# Altium schematic symbol library NSC Switcher.SchLib: 2027 symbols (part 24 of 26) (continued)
## LMZ10503TZE-ADJ/NOPB
designator U?
3A, SIMPLE SWITCHER® Power Module with 5.5V Maximum Input, 7 pin TO-PMOD; PartNumber: LMZ10503TZE-ADJ/NOPB; Manufacturer: National Semiconductor; PackageTopMarking: NSUZXYTTE#*LMZ10503*TZ-ADJ; PowerWise: N; Published: 16-Nov-2010; DatasheetVersion: Jun-2010; PackageVersion: revC, 2009; PackageReference: TZA07A; Publisher: Altium Limited; PackageDescription: TO-PMOD-7, 10.16 x 13.77 x 4.57 mm Body, 7 Lead, 1.27mm Pitch, Surface Mount; Supplier 1: Digi-Key; Supplier Part Number 1: LMZ10503TZE-ADJ/NOPB-ND; Supplier 2: Farnell; Supplier Part Number 2: 1821759; RoHS: Y; PinCount: 7; CompType: Switcher; ComponentLink1Description: LMZ10503 Datasheet; ComponentLink1URL: http://www.national.com/ds/LM/LMZ10503.pdf; ComponentLink2Description: LMZ10503 Web Page; ComponentLink2URL: http://www.national.com/pf/LM/LMZ10503.html; ComponentLink3Description: TZA07A Package Page; ComponentLink3URL: http://www.national.com/packaging/folders/tza07a.html
footprint TZA07A_V (D2-PAK, 8-Leads, Body 9.9x10.2mm, Pitch 1.27mm, Lead Span 13.8mm, NSC Recommended)
pins: 1 VIN (in), 2 EN (in), 3 SS, 4 GND (power), 5 FB (in), 6 VOUT (out), 7 VOUT (out), 8 EP

## LMZ10503TZX-ADJ/NOPB
designator U?
3A, SIMPLE SWITCHER® Power Module with 5.5V Maximum Input, 7 pin TO-PMOD; PartNumber: LMZ10503TZX-ADJ/NOPB; Manufacturer: National Semiconductor; PackageTopMarking: NSUZXYTTE#*LMZ10503*TZ-ADJ; PowerWise: Y; Published: 16-Nov-2010; DatasheetVersion: Jun-2010; PackageVersion: revC, 2009; PackageReference: TZA07A; Publisher: Altium Limited; PackageDescription: TO-PMOD-7, 10.16 x 13.77 x 4.57 mm Body, 7 Lead, 1.27mm Pitch, Surface Mount; Supplier 1: Digi-Key; Supplier Part Number 1: LMZ10503TZX-ADJ-ND; RoHS: Y; PinCount: 7; CompType: Switcher; ComponentLink1Description: LMZ10503 Datasheet; ComponentLink1URL: http://www.national.com/ds/LM/LMZ10503.pdf; ComponentLink2Description: LMZ10503 Web Page; ComponentLink2URL: http://www.national.com/pf/LM/LMZ10503.html; ComponentLink3Description: TZA07A Package Page; ComponentLink3URL: http://www.national.com/packaging/folders/tza07a.html
footprint TZA07A_V (D2-PAK, 8-Leads, Body 9.9x10.2mm, Pitch 1.27mm, Lead Span 13.8mm, NSC Recommended)
pins: 1 VIN (in), 2 EN (in), 3 SS, 4 GND (power), 5 FB (in), 6 VOUT (out), 7 VOUT (out), 8 EP

## LMZ10504EXTTZ/NOPB
designator U?
4A, SIMPLE SWITCHER® Power Module with 5.5V Maximum Input Voltage for Military and Rugged Applications, 7 pin TO-PMOD; PartNumber: LMZ10504EXTTZ/NOPB; Manufacturer: National Semiconductor; PackageTopMarking: NSUZXYTTE#*LMZ10504*EXT; PowerWise: Y; Published: 16-Nov-2010; DatasheetVersion: Jul-2010; PackageVersion: revC, 2009; PackageReference: TZA07A; Publisher: Altium Limited; PackageDescription: TO-PMOD-7, 10.16 x 13.77 x 4.57 mm Body, 7 Lead, 1.27mm Pitch, Surface Mount; Supplier 1: Digi-Key; Supplier Part Number 1: LMZ10504EXTTZ/NOPBTR-ND; Supplier 2: Digi-Key; Supplier Part Number 2: LMZ10504EXTTZ/NOPBCT-ND; Supplier 3: Digi-Key; Supplier Part Number 3: LMZ10504EXTTZ/NOPBDKR-ND; RoHS: Y; PinCount: 7; CompType: Switcher; ComponentLink1Description: LMZ10504EXT Datasheet; ComponentLink1URL: http://www.national.com/ds/LM/LMZ10504EXT.pdf; ComponentLink2Description: LMZ10504EXT Web Page; ComponentLink2URL: http://www.national.com/pf/LM/LMZ10504EXT.html; ComponentLink3Description: TZA07A Package Page; ComponentLink3URL: http://www.national.com/packaging/folders/tza07a.html
footprint TZA07A_V (D2-PAK, 8-Leads, Body 9.9x10.2mm, Pitch 1.27mm, Lead Span 13.8mm, NSC Recommended)
pins: 1 VIN (in), 2 EN (in), 3 SS, 4 GND (power), 5 FB (in), 6 VOUT (out), 7 VOUT (out), 8 EP

## LMZ10504EXTTZE/NOPB
designator U?
4A, SIMPLE SWITCHER® Power Module with 5.5V Maximum Input Voltage for Military and Rugged Applications, 7 pin TO-PMOD; PartNumber: LMZ10504EXTTZE/NOPB; Manufacturer: National Semiconductor; PackageTopMarking: NSUZXYTTE#*LMZ10504*EXT; PowerWise: Y; Published: 16-Nov-2010; DatasheetVersion: Jul-2010; PackageVersion: revC, 2009; PackageReference: TZA07A; Publisher: Altium Limited; PackageDescription: TO-PMOD-7, 10.16 x 13.77 x 4.57 mm Body, 7 Lead, 1.27mm Pitch, Surface Mount; Supplier 1: Digi-Key; Supplier Part Number 1: LMZ10504EXTTZE/NOPB-ND; RoHS: Y; PinCount: 7; CompType: Switcher; ComponentLink1Description: LMZ10504EXT Datasheet; ComponentLink1URL: http://www.national.com/ds/LM/LMZ10504EXT.pdf; ComponentLink2Description: LMZ10504EXT Web Page; ComponentLink2URL: http://www.national.com/pf/LM/LMZ10504EXT.html; ComponentLink3Description: TZA07A Package Page; ComponentLink3URL: http://www.national.com/packaging/folders/tza07a.html
footprint TZA07A_V (D2-PAK, 8-Leads, Body 9.9x10.2mm, Pitch 1.27mm, Lead Span 13.8mm, NSC Recommended)
pins: 1 VIN (in), 2 EN (in), 3 SS, 4 GND (power), 5 FB (in), 6 VOUT (out), 7 VOUT (out), 8 EP

## LMZ10504EXTTZX/NOPB
designator U?
4A, SIMPLE SWITCHER® Power Module with 5.5V Maximum Input Voltage for Military and Rugged Applications, 7 pin TO-PMOD; PartNumber: LMZ10504EXTTZX/NOPB; Manufacturer: National Semiconductor; PackageTopMarking: NSUZXYTTE#*LMZ10504*EXT; PowerWise: Y; Published: 16-Nov-2010; DatasheetVersion: Jul-2010; PackageVersion: revC, 2009; PackageReference: TZA07A; Publisher: Altium Limited; PackageDescription: TO-PMOD-7, 10.16 x 13.77 x 4.57 mm Body, 7 Lead, 1.27mm Pitch, Surface Mount; Supplier 1: Digi-Key; Supplier Part Number 1: LMZ10504EXTTZX/NOPB-ND; RoHS: Y; PinCount: 7; CompType: Switcher; ComponentLink1Description: LMZ10504EXT Datasheet; ComponentLink1URL: http://www.national.com/ds/LM/LMZ10504EXT.pdf; ComponentLink2Description: LMZ10504EXT Web Page; ComponentLink2URL: http://www.national.com/pf/LM/LMZ10504EXT.html; ComponentLink3Description: TZA07A Package Page; ComponentLink3URL: http://www.national.com/packaging/folders/tza07a.html
footprint TZA07A_V (D2-PAK, 8-Leads, Body 9.9x10.2mm, Pitch 1.27mm, Lead Span 13.8mm, NSC Recommended)
pins: 1 VIN (in), 2 EN (in), 3 SS, 4 GND (power), 5 FB (in), 6 VOUT (out), 7 VOUT (out), 8 EP

## LMZ10504TZ-ADJ/NOPB
designator U?
4A SIMPLE SWITCHER® Power Module with 5.5V Maximum Input Voltage, 7-pin TO-PMOD, Pb-Free; PartNumber: LMZ10504TZ-ADJ/NOPB; Manufacturer: National Semiconductor; PackageTopMarking: NSUZXYTTE#*LMZ10504*TZ-ADJ; PowerWise: Y; Published: 25-Jan-2010; DatasheetVersion: Jan-2010; PackageVersion: revC, 2009; PackageReference: TZA07A; Publisher: Altium Limited; PackageDescription: TO-PMOD-7, 10.16 x 13.77 x 4.57 mm Body, 7 Lead, 1.27mm Pitch, Surface Mount; Supplier 1: Digi-Key; Supplier Part Number 1: LMZ10504TZ-ADJTR-ND; Supplier 2: Digi-Key; Supplier Part Number 2: LMZ10504TZ-ADJCT-ND; Supplier 3: Digi-Key; Supplier Part Number 3: LMZ10504TZ-ADJDKR-ND; Supplier 4: Farnell; Supplier Part Number 4: 1780280; RoHS: Y; PinCount: 8; CompType: Switcher; ComponentLink1Description: LMZ10504 Datasheet; ComponentLink1URL: http://www.national.com/ds/LM/LMZ10504.pdf; ComponentLink2Description: LMZ10504 Web Page; ComponentLink2URL: http://www.national.com/pf/LM/LMZ10504.html; ComponentLink3Description: TZA07A Package Page; ComponentLink3URL: http://www.national.com/packaging/folders/tza07a.html
footprint TZA07A_V (D2-PAK, 8-Leads, Body 9.9x10.2mm, Pitch 1.27mm, Lead Span 13.8mm, NSC Recommended)
pins: 1 VIN (in), 2 EN (in), 3 SS, 4 GND (power), 5 FB (in), 6 VOUT (out), 7 VOUT (out), 8 EP

## LMZ10504TZE-ADJ/NOPB
designator U?
4A SIMPLE SWITCHER® Power Module with 5.5V Maximum Input, 7 pin TO-PMOD, Pb-Free; PartNumber: LMZ10504TZE-ADJ/NOPB; Manufacturer: National Semiconductor; PackageTopMarking: NSUZXYTTE#*LMZ10504*TZ-ADJ; PowerWise: N; Published: 1-Mar-2010; DatasheetVersion: Jan-2010; PackageVersion: revC, 2009; PackageReference: TZA07A; Publisher: Altium Limited; PackageDescription: TO-PMOD-7, 10.16 x 13.77 x 4.57 mm Body, 7 Lead, 1.27mm Pitch, Surface Mount; Supplier 1: Digi-Key; Supplier Part Number 1: LMZ10504TZE-ADJ/NOPB-ND; RoHS: Y; PinCount: 7; CompType: Switcher; ComponentLink1Description: LMZ10504 Datasheet; ComponentLink1URL: http://www.national.com/ds/LM/LMZ10504.pdf; ComponentLink2Description: LMZ10504 Web Page; ComponentLink2URL: http://www.national.com/pf/LM/LMZ10504.html; ComponentLink3Description: TZA07A Package Page; ComponentLink3URL: http://www.national.com/packaging/folders/tza07a.html
footprint TZA07A_V (D2-PAK, 8-Leads, Body 9.9x10.2mm, Pitch 1.27mm, Lead Span 13.8mm, NSC Recommended)
pins: 1 VIN (in), 2 EN (in), 3 SS, 4 GND (power), 5 FB (in), 6 VOUT (out), 7 VOUT (out), 8 EP

## LMZ10504TZX-ADJ/NOPB
designator U?
4A SIMPLE SWITCHER® Power Module with 5.5V Maximum Input Voltage, 7-pin TO-PMOD, Pb-Free; PartNumber: LMZ10504TZX-ADJ/NOPB; Manufacturer: National Semiconductor; PackageTopMarking: NSUZXYTTE#*LMZ10504*TZ-ADJ; PowerWise: Y; Published: 25-Jan-2010; DatasheetVersion: Jan-2010; PackageVersion: revC, 2009; PackageReference: TZA07A; Publisher: Altium Limited; PackageDescription: TO-PMOD-7, 10.16 x 13.77 x 4.57 mm Body, 7 Lead, 1.27mm Pitch, Surface Mount; Supplier 1: Digi-Key; Supplier Part Number 1: LMZ10504TZX-ADJ-ND; Supplier 2: Farnell; Supplier Part Number 2: 1780282; RoHS: Y; PinCount: 8; CompType: Switcher; ComponentLink1Description: LMZ10504 Datasheet; ComponentLink1URL: http://www.national.com/ds/LM/LMZ10504.pdf; ComponentLink2Description: LMZ10504 Web Page; ComponentLink2URL: http://www.national.com/pf/LM/LMZ10504.html; ComponentLink3Description: TZA07A Package Page; ComponentLink3URL: http://www.national.com/packaging/folders/tza07a.html
footprint TZA07A_V (D2-PAK, 8-Leads, Body 9.9x10.2mm, Pitch 1.27mm, Lead Span 13.8mm, NSC Recommended)
pins: 1 VIN (in), 2 EN (in), 3 SS, 4 GND (power), 5 FB (in), 6 VOUT (out), 7 VOUT (out), 8 EP

## LMZ10505EXTTZ/NOPB
designator U?
5A SIMPLE SWITCHER® Power Module with 5.5V Maximum Input Voltage for Military and Rugged Applications, 7 pin TO-PMOD; PartNumber: LMZ10505EXTTZ/NOPB; Manufacturer: National Semiconductor; PackageTopMarking: NSUZXYTTE#*LMZ10505*EXT; PowerWise: Y; Published: 16-Nov-2010; DatasheetVersion: Jul-2010; PackageVersion: revC, 2009; PackageReference: TZA07A; Publisher: Altium Limited; PackageDescription: TO-PMOD-7, 10.16 x 13.77 x 4.57 mm Body, 7 Lead, 1.27mm Pitch, Surface Mount; Supplier 1: Digi-Key; Supplier Part Number 1: LMZ10505EXTTZ/NOPBTR-ND; Supplier 2: Digi-Key; Supplier Part Number 2: LMZ10505EXTTZ/NOPBCT-ND; Supplier 3: Digi-Key; Supplier Part Number 3: LMZ10505EXTTZ/NOPBDKR-ND; RoHS: Y; PinCount: 7; CompType: Switcher; ComponentLink1Description: LMZ10505EXT Datasheet; ComponentLink1URL: http://www.national.com/ds/LM/LMZ10505EXT.pdf; ComponentLink2Description: LMZ10505EXT Web Page; ComponentLink2URL: http://www.national.com/pf/LM/LMZ10505EXT.html; ComponentLink3Description: TZA07A Package Page; ComponentLink3URL: http://www.national.com/packaging/folders/tza07a.html
footprint TZA07A_V (D2-PAK, 8-Leads, Body 9.9x10.2mm, Pitch 1.27mm, Lead Span 13.8mm, NSC Recommended)
pins: 1 VIN (in), 2 EN (in), 3 SS, 4 GND (power), 5 FB (in), 6 VOUT (out), 7 VOUT (out), 8 EP

## LMZ10505EXTTZE/NOPB
designator U?
5A SIMPLE SWITCHER® Power Module with 5.5V Maximum Input Voltage for Military and Rugged Applications, 7 pin TO-PMOD; PartNumber: LMZ10505EXTTZE/NOPB; Manufacturer: National Semiconductor; PackageTopMarking: NSUZXYTTE#*LMZ10505*EXT; PowerWise: Y; Published: 16-Nov-2010; DatasheetVersion: Jul-2010; PackageVersion: revC, 2009; PackageReference: TZA07A; Publisher: Altium Limited; PackageDescription: TO-PMOD-7, 10.16 x 13.77 x 4.57 mm Body, 7 Lead, 1.27mm Pitch, Surface Mount; Supplier 1: Digi-Key; Supplier Part Number 1: LMZ10505EXTTZE/NOPB-ND; RoHS: Y; PinCount: 7; CompType: Switcher; ComponentLink1Description: LMZ10505EXT Datasheet; ComponentLink1URL: http://www.national.com/ds/LM/LMZ10505EXT.pdf; ComponentLink2Description: LMZ10505EXT Web Page; ComponentLink2URL: http://www.national.com/pf/LM/LMZ10505EXT.html; ComponentLink3Description: TZA07A Package Page; ComponentLink3URL: http://www.national.com/packaging/folders/tza07a.html
footprint TZA07A_V (D2-PAK, 8-Leads, Body 9.9x10.2mm, Pitch 1.27mm, Lead Span 13.8mm, NSC Recommended)
pins: 1 VIN (in), 2 EN (in), 3 SS, 4 GND (power), 5 FB (in), 6 VOUT (out), 7 VOUT (out), 8 EP

## LMZ10505EXTTZX/NOPB
designator U?
5A SIMPLE SWITCHER® Power Module with 5.5V Maximum Input Voltage for Military and Rugged Applications, 7 pin TO-PMOD; PartNumber: LMZ10505EXTTZX/NOPB; Manufacturer: National Semiconductor; PackageTopMarking: NSUZXYTTE#*LMZ10505*EXT; PowerWise: Y; Published: 16-Nov-2010; DatasheetVersion: Jul-2010; PackageVersion: revC, 2009; PackageReference: TZA07A; Publisher: Altium Limited; PackageDescription: TO-PMOD-7, 10.16 x 13.77 x 4.57 mm Body, 7 Lead, 1.27mm Pitch, Surface Mount; Supplier 1: Digi-Key; Supplier Part Number 1: LMZ10505EXTTZX/NOPB-ND; RoHS: Y; PinCount: 7; CompType: Switcher; ComponentLink1Description: LMZ10505EXT Datasheet; ComponentLink1URL: http://www.national.com/ds/LM/LMZ10505EXT.pdf; ComponentLink2Description: LMZ10505EXT Web Page; ComponentLink2URL: http://www.national.com/pf/LM/LMZ10505EXT.html; ComponentLink3Description: TZA07A Package Page; ComponentLink3URL: http://www.national.com/packaging/folders/tza07a.html
footprint TZA07A_V (D2-PAK, 8-Leads, Body 9.9x10.2mm, Pitch 1.27mm, Lead Span 13.8mm, NSC Recommended)
pins: 1 VIN (in), 2 EN (in), 3 SS, 4 GND (power), 5 FB (in), 6 VOUT (out), 7 VOUT (out), 8 EP

## LMZ10505TZ-ADJ/NOPB
designator U?
5A SIMPLE SWITCHER® Power Module with 5.5V Maximum Input Voltage, 7 pin TO-PMOD; PartNumber: LMZ10505TZ-ADJ/NOPB; Manufacturer: National Semiconductor; PackageTopMarking: NSUZXYTTE#*LMZ10505*TZ-ADJ; PowerWise: Y; Published: 16-Nov-2010; DatasheetVersion: Jun-2010; PackageVersion: revC, 2009; PackageReference: TZA07A; Publisher: Altium Limited; PackageDescription: TO-PMOD-7, 10.16 x 13.77 x 4.57 mm Body, 7 Lead, 1.27mm Pitch, Surface Mount; Supplier 1: Digi-Key; Supplier Part Number 1: LMZ10505TZ-ADJTR-ND; Supplier 2: Digi-Key; Supplier Part Number 2: LMZ10505TZ-ADJCT-ND; Supplier 3: Digi-Key; Supplier Part Number 3: LMZ10505TZ-ADJDKR-ND; Supplier 4: Farnell; Supplier Part Number 4: 1800192; RoHS: Y; PinCount: 7; CompType: Switcher; ComponentLink1Description: LMZ10505 Datasheet; ComponentLink1URL: http://www.national.com/ds/LM/LMZ10505.pdf; ComponentLink2Description: LMZ10505 Web Page; ComponentLink2URL: http://www.national.com/pf/LM/LMZ10505.html; ComponentLink3Description: TZA07A Package Page; ComponentLink3URL: http://www.national.com/packaging/folders/tza07a.html
footprint TZA07A_V (D2-PAK, 8-Leads, Body 9.9x10.2mm, Pitch 1.27mm, Lead Span 13.8mm, NSC Recommended)
pins: 1 VIN (in), 2 EN (in), 3 SS, 4 GND (power), 5 FB (in), 6 VOUT (out), 7 VOUT (out), 8 EP

## LMZ10505TZE-ADJ/NOPB
designator U?
5A SIMPLE SWITCHER® Power Module with 5.5V Maximum Input Voltage, 7 pin TO-PMOD; PartNumber: LMZ10505TZE-ADJ/NOPB; Manufacturer: National Semiconductor; PackageTopMarking: NSUZXYTTE#*LMZ10505*TZ-ADJ; PowerWise: N; Published: 16-Nov-2010; DatasheetVersion: Jun-2010; PackageVersion: revC, 2009; PackageReference: TZA07A; Publisher: Altium Limited; PackageDescription: TO-PMOD-7, 10.16 x 13.77 x 4.57 mm Body, 7 Lead, 1.27mm Pitch, Surface Mount; Supplier 1: Digi-Key; Supplier Part Number 1: LMZ10505TZE-ADJ/NOPB-ND; RoHS: Y; PinCount: 7; CompType: Switcher; ComponentLink1Description: LMZ10505 Datasheet; ComponentLink1URL: http://www.national.com/ds/LM/LMZ10505.pdf; ComponentLink2Description: LMZ10505 Web Page; ComponentLink2URL: http://www.national.com/pf/LM/LMZ10505.html; ComponentLink3Description: TZA07A Package Page; ComponentLink3URL: http://www.national.com/packaging/folders/tza07a.html
footprint TZA07A_V (D2-PAK, 8-Leads, Body 9.9x10.2mm, Pitch 1.27mm, Lead Span 13.8mm, NSC Recommended)
pins: 1 VIN (in), 2 EN (in), 3 SS, 4 GND (power), 5 FB (in), 6 VOUT (out), 7 VOUT (out), 8 EP

## LMZ10505TZX-ADJ/NOPB
designator U?
5A SIMPLE SWITCHER® Power Module with 5.5V Maximum Input Voltage, 7 pin TO-PMOD; PartNumber: LMZ10505TZX-ADJ/NOPB; Manufacturer: National Semiconductor; PackageTopMarking: NSUZXYTTE#*LMZ10505*TZ-ADJ; PowerWise: Y; Published: 16-Nov-2010; DatasheetVersion: Jun-2010; PackageVersion: revC, 2009; PackageReference: TZA07A; Publisher: Altium Limited; PackageDescription: TO-PMOD-7, 10.16 x 13.77 x 4.57 mm Body, 7 Lead, 1.27mm Pitch, Surface Mount; Supplier 1: Digi-Key; Supplier Part Number 1: LMZ10505TZX-ADJ-ND; RoHS: Y; PinCount: 7; CompType: Switcher; ComponentLink1Description: LMZ10505 Datasheet; ComponentLink1URL: http://www.national.com/ds/LM/LMZ10505.pdf; ComponentLink2Description: LMZ10505 Web Page; ComponentLink2URL: http://www.national.com/pf/LM/LMZ10505.html; ComponentLink3Description: TZA07A Package Page; ComponentLink3URL: http://www.national.com/packaging/folders/tza07a.html
footprint TZA07A_V (D2-PAK, 8-Leads, Body 9.9x10.2mm, Pitch 1.27mm, Lead Span 13.8mm, NSC Recommended)
pins: 1 VIN (in), 2 EN (in), 3 SS, 4 GND (power), 5 FB (in), 6 VOUT (out), 7 VOUT (out), 8 EP

## LMZ12001EXTTZ/NOPB
designator U?
1A SIMPLE SWITCHER® Power Module with 20V Maximum Input Voltage for Military and Rugged Applications, 7 pin TO-PMOD; PartNumber: LMZ12001EXTTZ/NOPB; Manufacturer: National Semiconductor; PackageTopMarking: NSUZXYTTE#*LMZ12001*EXT; PowerWise: Y; Published: 16-Nov-2010; DatasheetVersion: Aug-2010; PackageVersion: revC, 2009; PackageReference: TZA07A; Publisher: Altium Limited; PackageDescription: TO-PMOD-7, 10.16 x 13.77 x 4.57 mm Body, 7 Lead, 1.27mm Pitch, Surface Mount; Supplier 1: Digi-Key; Supplier Part Number 1: LMZ12001EXTTZ/NOPBTR-ND; Supplier 2: Digi-Key; Supplier Part Number 2: LMZ12001EXTTZ/NOPBCT-ND; Supplier 3: Digi-Key; Supplier Part Number 3: LMZ12001EXTTZ/NOPBDKR-ND; RoHS: Y; PinCount: 7; CompType: Switcher; ComponentLink1Description: LMZ12001EXT Datasheet; ComponentLink1URL: http://www.national.com/ds/LM/LMZ12001EXT.pdf; ComponentLink2Description: LMZ12001EXT Web Page; ComponentLink2URL: http://www.national.com/pf/LM/LMZ12001EXT.html; ComponentLink3Description: TZA07A Package Page; ComponentLink3URL: http://www.national.com/packaging/folders/tza07a.html
footprint TZA07A_V (D2-PAK, 8-Leads, Body 9.9x10.2mm, Pitch 1.27mm, Lead Span 13.8mm, NSC Recommended)
pins: 1 VIN (in), 2 RON, 3 EN (in), 4 GND (power), 5 SS, 6 FB (in), 7 VOUT (out), 8 EP

## LMZ12001EXTTZE/NOPB
designator U?
1A SIMPLE SWITCHER® Power Module with 20V Maximum Input Voltage for Military and Rugged Applications, 7 pin TO-PMOD; PartNumber: LMZ12001EXTTZE/NOPB; Manufacturer: National Semiconductor; PackageTopMarking: NSUZXYTTE#*LMZ12001*EXT; PowerWise: Y; Published: 16-Nov-2010; DatasheetVersion: Aug-2010; PackageVersion: revC, 2009; PackageReference: TZA07A; Publisher: Altium Limited; PackageDescription: TO-PMOD-7, 10.16 x 13.77 x 4.57 mm Body, 7 Lead, 1.27mm Pitch, Surface Mount; Supplier 1: Digi-Key; Supplier Part Number 1: LMZ12001EXTTZE/NOPB-ND; RoHS: Y; PinCount: 7; CompType: Switcher; ComponentLink1Description: LMZ12001EXT Datasheet; ComponentLink1URL: http://www.national.com/ds/LM/LMZ12001EXT.pdf; ComponentLink2Description: LMZ12001EXT Web Page; ComponentLink2URL: http://www.national.com/pf/LM/LMZ12001EXT.html; ComponentLink3Description: TZA07A Package Page; ComponentLink3URL: http://www.national.com/packaging/folders/tza07a.html
footprint TZA07A_V (D2-PAK, 8-Leads, Body 9.9x10.2mm, Pitch 1.27mm, Lead Span 13.8mm, NSC Recommended)
pins: 1 VIN (in), 2 RON, 3 EN (in), 4 GND (power), 5 SS, 6 FB (in), 7 VOUT (out), 8 EP

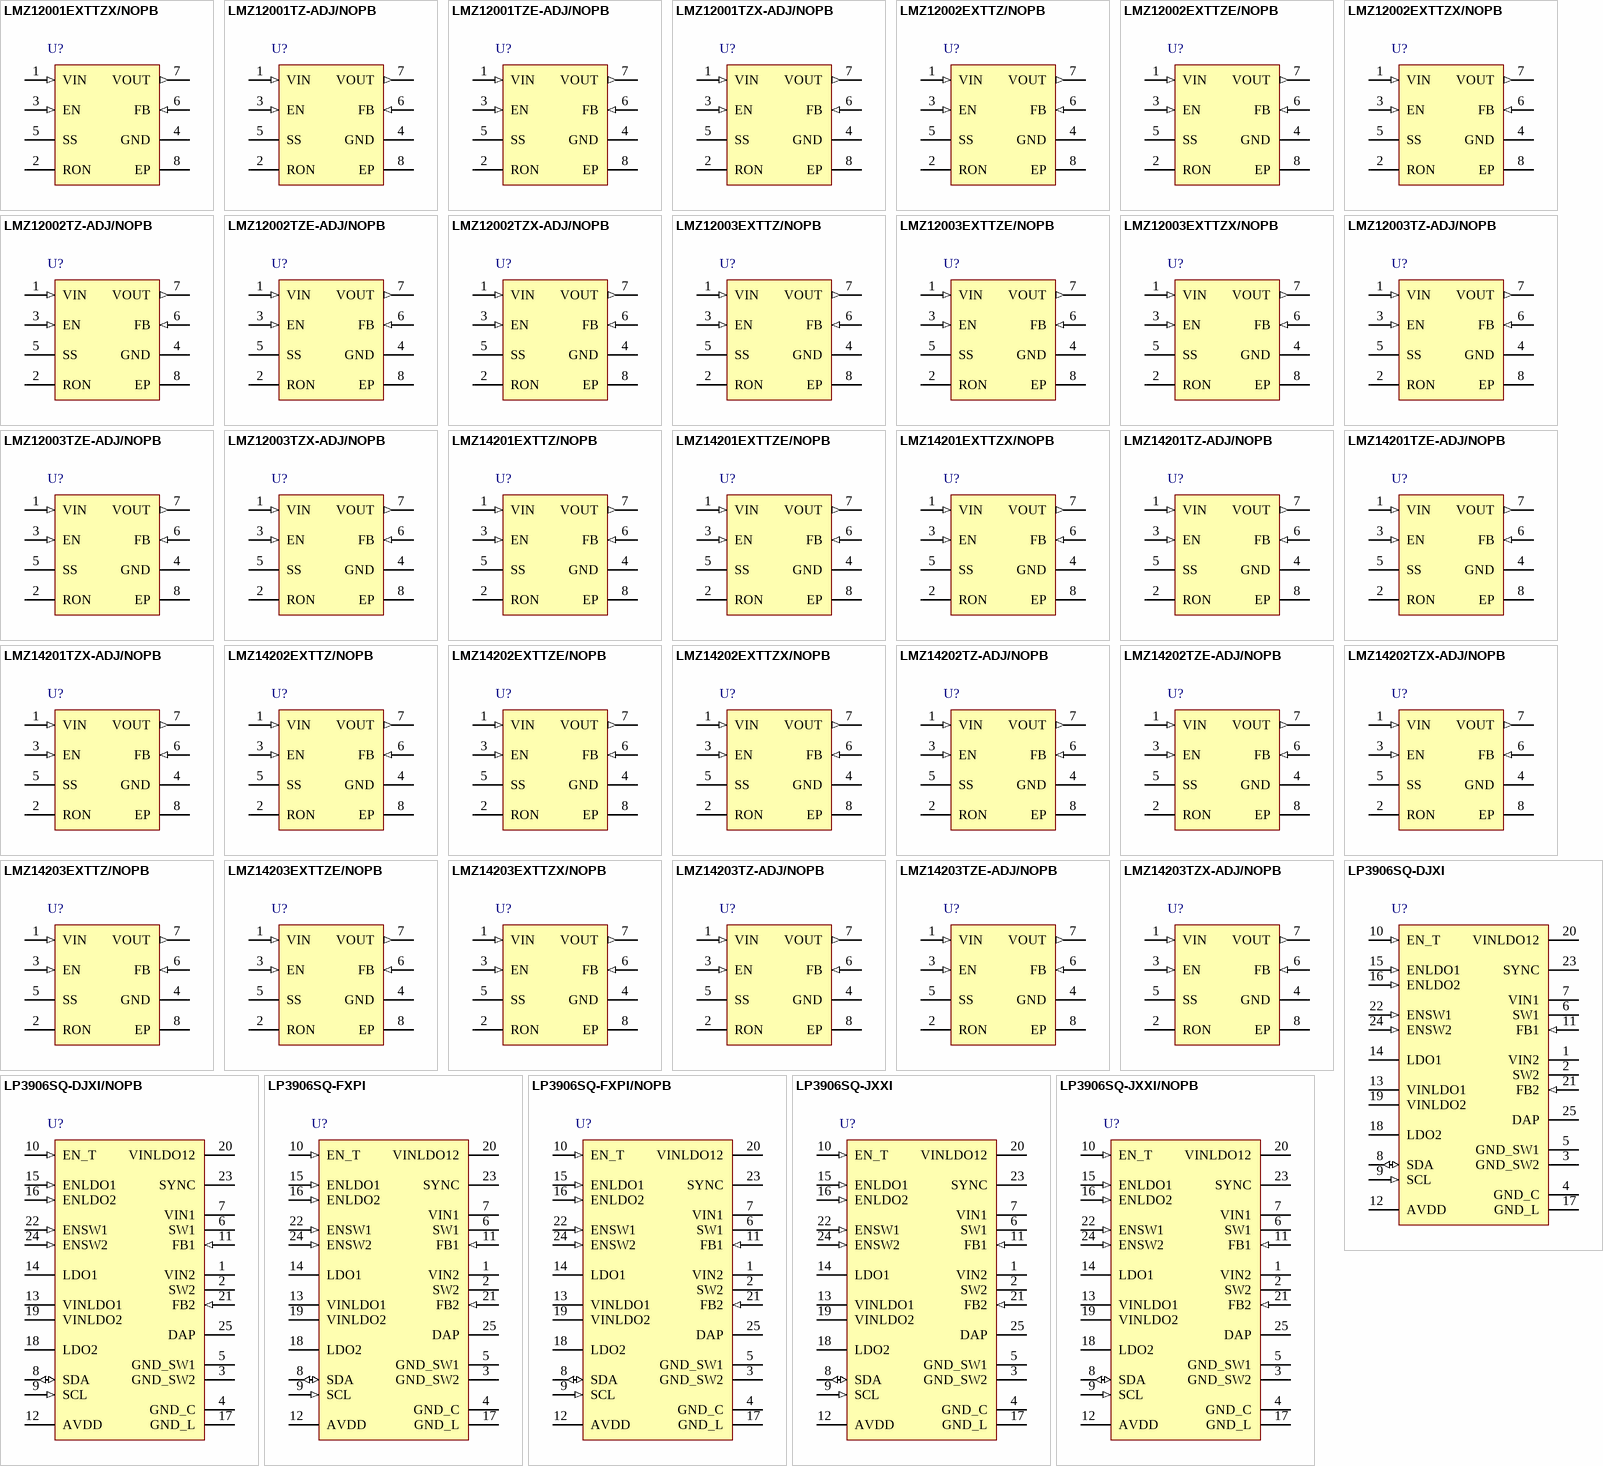
[diagram p58: symbols LMZ12001EXTTZX/NOPB to LP3906SQ-JXXI/NOPB]

## LMZ12001EXTTZX/NOPB
designator U?
1A SIMPLE SWITCHER® Power Module with 20V Maximum Input Voltage for Military and Rugged Applications, 7 pin TO-PMOD; PartNumber: LMZ12001EXTTZX/NOPB; Manufacturer: National Semiconductor; PackageTopMarking: NSUZXYTTE#*LMZ12001*EXT; PowerWise: Y; Published: 16-Nov-2010; DatasheetVersion: Aug-2010; PackageVersion: revC, 2009; PackageReference: TZA07A; Publisher: Altium Limited; PackageDescription: TO-PMOD-7, 10.16 x 13.77 x 4.57 mm Body, 7 Lead, 1.27mm Pitch, Surface Mount; Supplier 1: Digi-Key; Supplier Part Number 1: LMZ12001EXTTZX/NOPB-ND; RoHS: Y; PinCount: 7; CompType: Switcher; ComponentLink1Description: LMZ12001EXT Datasheet; ComponentLink1URL: http://www.national.com/ds/LM/LMZ12001EXT.pdf; ComponentLink2Description: LMZ12001EXT Web Page; ComponentLink2URL: http://www.national.com/pf/LM/LMZ12001EXT.html; ComponentLink3Description: TZA07A Package Page; ComponentLink3URL: http://www.national.com/packaging/folders/tza07a.html
footprint TZA07A_V (D2-PAK, 8-Leads, Body 9.9x10.2mm, Pitch 1.27mm, Lead Span 13.8mm, NSC Recommended)
pins: 1 VIN (in), 2 RON, 3 EN (in), 4 GND (power), 5 SS, 6 FB (in), 7 VOUT (out), 8 EP

## LMZ12001TZ-ADJ/NOPB
designator U?
1A SIMPLE SWITCHER® Power Module with 20V Maximum Input Voltage, 7 pin TO-PMOD; PartNumber: LMZ12001TZ-ADJ/NOPB; Manufacturer: National Semiconductor; PackageTopMarking: NSUZXYTTE#*LMZ12001*TZ-ADJ; PowerWise: Y; Published: 16-Nov-2010; DatasheetVersion: Jun-2010; PackageVersion: revC, 2009; PackageReference: TZA07A; Publisher: Altium Limited; PackageDescription: TO-PMOD-7, 10.16 x 13.77 x 4.57 mm Body, 7 Lead, 1.27mm Pitch, Surface Mount; Supplier 1: Digi-Key; Supplier Part Number 1: LMZ12001TZ-ADJTR-ND; Supplier 2: Digi-Key; Supplier Part Number 2: LMZ12001TZ-ADJCT-ND; Supplier 3: Digi-Key; Supplier Part Number 3: LMZ12001TZ-ADJDKR-ND; RoHS: Y; PinCount: 7; CompType: Switcher; ComponentLink1Description: LMZ12001 Datasheet; ComponentLink1URL: http://www.national.com/ds/LM/LMZ12001.pdf; ComponentLink2Description: LMZ12001 Web Page; ComponentLink2URL: http://www.national.com/pf/LM/LMZ12001.html; ComponentLink3Description: TZA07A Package Page; ComponentLink3URL: http://www.national.com/packaging/folders/tza07a.html
footprint TZA07A_V (D2-PAK, 8-Leads, Body 9.9x10.2mm, Pitch 1.27mm, Lead Span 13.8mm, NSC Recommended)
pins: 1 VIN (in), 2 RON, 3 EN (in), 4 GND (power), 5 SS, 6 FB (in), 7 VOUT (out), 8 EP

## LMZ12001TZE-ADJ/NOPB
designator U?
1A SIMPLE SWITCHER® Power Module with 20V Maximum Input Voltage, 7 pin TO-PMOD; PartNumber: LMZ12001TZE-ADJ/NOPB; Manufacturer: National Semiconductor; PackageTopMarking: NSUZXYTTE#*LMZ12001*TZ-ADJ; PowerWise: N; Published: 16-Nov-2010; DatasheetVersion: Jun-2010; PackageVersion: revC, 2009; PackageReference: TZA07A; Publisher: Altium Limited; PackageDescription: TO-PMOD-7, 10.16 x 13.77 x 4.57 mm Body, 7 Lead, 1.27mm Pitch, Surface Mount; Supplier 1: Digi-Key; Supplier Part Number 1: LMZ12001TZE-ADJ/NOPB-ND; Supplier 2: Farnell; Supplier Part Number 2: 1821760; RoHS: Y; PinCount: 7; CompType: Switcher; ComponentLink1Description: LMZ12001 Datasheet; ComponentLink1URL: http://www.national.com/ds/LM/LMZ12001.pdf; ComponentLink2Description: LMZ12001 Web Page; ComponentLink2URL: http://www.national.com/pf/LM/LMZ12001.html; ComponentLink3Description: TZA07A Package Page; ComponentLink3URL: http://www.national.com/packaging/folders/tza07a.html
footprint TZA07A_V (D2-PAK, 8-Leads, Body 9.9x10.2mm, Pitch 1.27mm, Lead Span 13.8mm, NSC Recommended)
pins: 1 VIN (in), 2 RON, 3 EN (in), 4 GND (power), 5 SS, 6 FB (in), 7 VOUT (out), 8 EP

## LMZ12001TZX-ADJ/NOPB
designator U?
1A SIMPLE SWITCHER® Power Module with 20V Maximum Input Voltage, 7 pin TO-PMOD; PartNumber: LMZ12001TZX-ADJ/NOPB; Manufacturer: National Semiconductor; PackageTopMarking: NSUZXYTTE#*LMZ12001*TZ-ADJ; PowerWise: Y; Published: 16-Nov-2010; DatasheetVersion: Jun-2010; PackageVersion: revC, 2009; PackageReference: TZA07A; Publisher: Altium Limited; PackageDescription: TO-PMOD-7, 10.16 x 13.77 x 4.57 mm Body, 7 Lead, 1.27mm Pitch, Surface Mount; Supplier 1: Digi-Key; Supplier Part Number 1: LMZ12001TZX-ADJ-ND; RoHS: Y; PinCount: 7; CompType: Switcher; ComponentLink1Description: LMZ12001 Datasheet; ComponentLink1URL: http://www.national.com/ds/LM/LMZ12001.pdf; ComponentLink2Description: LMZ12001 Web Page; ComponentLink2URL: http://www.national.com/pf/LM/LMZ12001.html; ComponentLink3Description: TZA07A Package Page; ComponentLink3URL: http://www.national.com/packaging/folders/tza07a.html
footprint TZA07A_V (D2-PAK, 8-Leads, Body 9.9x10.2mm, Pitch 1.27mm, Lead Span 13.8mm, NSC Recommended)
pins: 1 VIN (in), 2 RON, 3 EN (in), 4 GND (power), 5 SS, 6 FB (in), 7 VOUT (out), 8 EP

## LMZ12002EXTTZ/NOPB
designator U?
2A SIMPLE SWITCHER® Power Module with 20V Maximum Input Voltage for Military and Rugged Applications, 7 pin TO-PMOD; PartNumber: LMZ12002EXTTZ/NOPB; Manufacturer: National Semiconductor; PackageTopMarking: NSUZXYTTE#*LMZ12002*EXT; PowerWise: Y; Published: 16-Nov-2010; DatasheetVersion: Aug-2010; PackageVersion: revC, 2009; PackageReference: TZA07A; Publisher: Altium Limited; PackageDescription: TO-PMOD-7, 10.16 x 13.77 x 4.57 mm Body, 7 Lead, 1.27mm Pitch, Surface Mount; Supplier 1: Digi-Key; Supplier Part Number 1: LMZ12002EXTTZ/NOPBTR-ND; Supplier 2: Digi-Key; Supplier Part Number 2: LMZ12002EXTTZ/NOPBCT-ND; Supplier 3: Digi-Key; Supplier Part Number 3: LMZ12002EXTTZ/NOPBDKR-ND; RoHS: Y; PinCount: 7; CompType: Switcher; ComponentLink1Description: LMZ12002EXT Datasheet; ComponentLink1URL: http://www.national.com/ds/LM/LMZ12002EXT.pdf; ComponentLink2Description: LMZ12002EXT Web Page; ComponentLink2URL: http://www.national.com/pf/LM/LMZ12002EXT.html; ComponentLink3Description: TZA07A Package Page; ComponentLink3URL: http://www.national.com/packaging/folders/tza07a.html
footprint TZA07A_V (D2-PAK, 8-Leads, Body 9.9x10.2mm, Pitch 1.27mm, Lead Span 13.8mm, NSC Recommended)
pins: 1 VIN (in), 2 RON, 3 EN (in), 4 GND (power), 5 SS, 6 FB (in), 7 VOUT (out), 8 EP

## LMZ12002EXTTZE/NOPB
designator U?
2A SIMPLE SWITCHER® Power Module with 20V Maximum Input Voltage for Military and Rugged Applications, 7 pin TO-PMOD; PartNumber: LMZ12002EXTTZE/NOPB; Manufacturer: National Semiconductor; PackageTopMarking: NSUZXYTTE#*LMZ12002*EXT; PowerWise: Y; Published: 16-Nov-2010; DatasheetVersion: Aug-2010; PackageVersion: revC, 2009; PackageReference: TZA07A; Publisher: Altium Limited; PackageDescription: TO-PMOD-7, 10.16 x 13.77 x 4.57 mm Body, 7 Lead, 1.27mm Pitch, Surface Mount; Supplier 1: Digi-Key; Supplier Part Number 1: LMZ12002EXTTZE/NOPB-ND; RoHS: Y; PinCount: 7; CompType: Switcher; ComponentLink1Description: LMZ12002EXT Datasheet; ComponentLink1URL: http://www.national.com/ds/LM/LMZ12002EXT.pdf; ComponentLink2Description: LMZ12002EXT Web Page; ComponentLink2URL: http://www.national.com/pf/LM/LMZ12002EXT.html; ComponentLink3Description: TZA07A Package Page; ComponentLink3URL: http://www.national.com/packaging/folders/tza07a.html
footprint TZA07A_V (D2-PAK, 8-Leads, Body 9.9x10.2mm, Pitch 1.27mm, Lead Span 13.8mm, NSC Recommended)
pins: 1 VIN (in), 2 RON, 3 EN (in), 4 GND (power), 5 SS, 6 FB (in), 7 VOUT (out), 8 EP

## LMZ12002EXTTZX/NOPB
designator U?
2A SIMPLE SWITCHER® Power Module with 20V Maximum Input Voltage for Military and Rugged Applications, 7 pin TO-PMOD; PartNumber: LMZ12002EXTTZX/NOPB; Manufacturer: National Semiconductor; PackageTopMarking: NSUZXYTTE#*LMZ12002*EXT; PowerWise: Y; Published: 16-Nov-2010; DatasheetVersion: Aug-2010; PackageVersion: revC, 2009; PackageReference: TZA07A; Publisher: Altium Limited; PackageDescription: TO-PMOD-7, 10.16 x 13.77 x 4.57 mm Body, 7 Lead, 1.27mm Pitch, Surface Mount; Supplier 1: Digi-Key; Supplier Part Number 1: LMZ12002EXTTZX/NOPB-ND; RoHS: Y; PinCount: 7; CompType: Switcher; ComponentLink1Description: LMZ12002EXT Datasheet; ComponentLink1URL: http://www.national.com/ds/LM/LMZ12002EXT.pdf; ComponentLink2Description: LMZ12002EXT Web Page; ComponentLink2URL: http://www.national.com/pf/LM/LMZ12002EXT.html; ComponentLink3Description: TZA07A Package Page; ComponentLink3URL: http://www.national.com/packaging/folders/tza07a.html
footprint TZA07A_V (D2-PAK, 8-Leads, Body 9.9x10.2mm, Pitch 1.27mm, Lead Span 13.8mm, NSC Recommended)
pins: 1 VIN (in), 2 RON, 3 EN (in), 4 GND (power), 5 SS, 6 FB (in), 7 VOUT (out), 8 EP

## LMZ12002TZ-ADJ/NOPB
designator U?
2A SIMPLE SWITCHER® Power Module with 20V Maximum Input Voltage, 7 pin TO-PMOD; PartNumber: LMZ12002TZ-ADJ/NOPB; Manufacturer: National Semiconductor; PackageTopMarking: NSUZXYTTE#*LMZ12002*TZ-ADJ; PowerWise: Y; Published: 16-Nov-2010; DatasheetVersion: Jun-2010; PackageVersion: revC, 2009; PackageReference: TZA07A; Publisher: Altium Limited; PackageDescription: TO-PMOD-7, 10.16 x 13.77 x 4.57 mm Body, 7 Lead, 1.27mm Pitch, Surface Mount; Supplier 1: Digi-Key; Supplier Part Number 1: LMZ12002TZ-ADJTR-ND; Supplier 2: Digi-Key; Supplier Part Number 2: LMZ12002TZ-ADJCT-ND; Supplier 3: Digi-Key; Supplier Part Number 3: LMZ12002TZ-ADJDKR-ND; RoHS: Y; PinCount: 7; CompType: Switcher; ComponentLink1Description: LMZ12002 Datasheet; ComponentLink1URL: http://www.national.com/ds/LM/LMZ12002.pdf; ComponentLink2Description: LMZ12002 Web Page; ComponentLink2URL: http://www.national.com/pf/LM/LMZ12002.html; ComponentLink3Description: TZA07A Package Page; ComponentLink3URL: http://www.national.com/packaging/folders/tza07a.html
footprint TZA07A_V (D2-PAK, 8-Leads, Body 9.9x10.2mm, Pitch 1.27mm, Lead Span 13.8mm, NSC Recommended)
pins: 1 VIN (in), 2 RON, 3 EN (in), 4 GND (power), 5 SS, 6 FB (in), 7 VOUT (out), 8 EP

## LMZ12002TZE-ADJ/NOPB
designator U?
2A SIMPLE SWITCHER® Power Module with 20V Maximum Input Voltage, 7 pin TO-PMOD; PartNumber: LMZ12002TZE-ADJ/NOPB; Manufacturer: National Semiconductor; PackageTopMarking: NSUZXYTTE#*LMZ12002*TZ-ADJ; PowerWise: N; Published: 16-Nov-2010; DatasheetVersion: Jun-2010; PackageVersion: revC, 2009; PackageReference: TZA07A; Publisher: Altium Limited; PackageDescription: TO-PMOD-7, 10.16 x 13.77 x 4.57 mm Body, 7 Lead, 1.27mm Pitch, Surface Mount; Supplier 1: Digi-Key; Supplier Part Number 1: LMZ12002TZE-ADJ/NOPB-ND; Supplier 2: Farnell; Supplier Part Number 2: 1821761; RoHS: Y; PinCount: 7; CompType: Switcher; ComponentLink1Description: LMZ12002 Datasheet; ComponentLink1URL: http://www.national.com/ds/LM/LMZ12002.pdf; ComponentLink2Description: LMZ12002 Web Page; ComponentLink2URL: http://www.national.com/pf/LM/LMZ12002.html; ComponentLink3Description: TZA07A Package Page; ComponentLink3URL: http://www.national.com/packaging/folders/tza07a.html
footprint TZA07A_V (D2-PAK, 8-Leads, Body 9.9x10.2mm, Pitch 1.27mm, Lead Span 13.8mm, NSC Recommended)
pins: 1 VIN (in), 2 RON, 3 EN (in), 4 GND (power), 5 SS, 6 FB (in), 7 VOUT (out), 8 EP

## LMZ12002TZX-ADJ/NOPB
designator U?
2A SIMPLE SWITCHER® Power Module with 20V Maximum Input Voltage, 7 pin TO-PMOD; PartNumber: LMZ12002TZX-ADJ/NOPB; Manufacturer: National Semiconductor; PackageTopMarking: NSUZXYTTE#*LMZ12002*TZ-ADJ; PowerWise: Y; Published: 16-Nov-2010; DatasheetVersion: Jun-2010; PackageVersion: revC, 2009; PackageReference: TZA07A; Publisher: Altium Limited; PackageDescription: TO-PMOD-7, 10.16 x 13.77 x 4.57 mm Body, 7 Lead, 1.27mm Pitch, Surface Mount; Supplier 1: Digi-Key; Supplier Part Number 1: LMZ12002TZX-ADJ-ND; RoHS: Y; PinCount: 7; CompType: Switcher; ComponentLink1Description: LMZ12002 Datasheet; ComponentLink1URL: http://www.national.com/ds/LM/LMZ12002.pdf; ComponentLink2Description: LMZ12002 Web Page; ComponentLink2URL: http://www.national.com/pf/LM/LMZ12002.html; ComponentLink3Description: TZA07A Package Page; ComponentLink3URL: http://www.national.com/packaging/folders/tza07a.html
footprint TZA07A_V (D2-PAK, 8-Leads, Body 9.9x10.2mm, Pitch 1.27mm, Lead Span 13.8mm, NSC Recommended)
pins: 1 VIN (in), 2 RON, 3 EN (in), 4 GND (power), 5 SS, 6 FB (in), 7 VOUT (out), 8 EP